# Altium footprint library Mi Libreria.PcbLib: 184 footprints (part 10 of 12)
Each footprint in its own frame and in the unit in brackets; x right, y up, seen from the top. Pads: shape width x height; smd on the part's side, far side on the other; paste and mask are expansions set on the pad; w line width, h text height; cw(c..) or ccw(c..) is an arc to the next point about the centre after c.
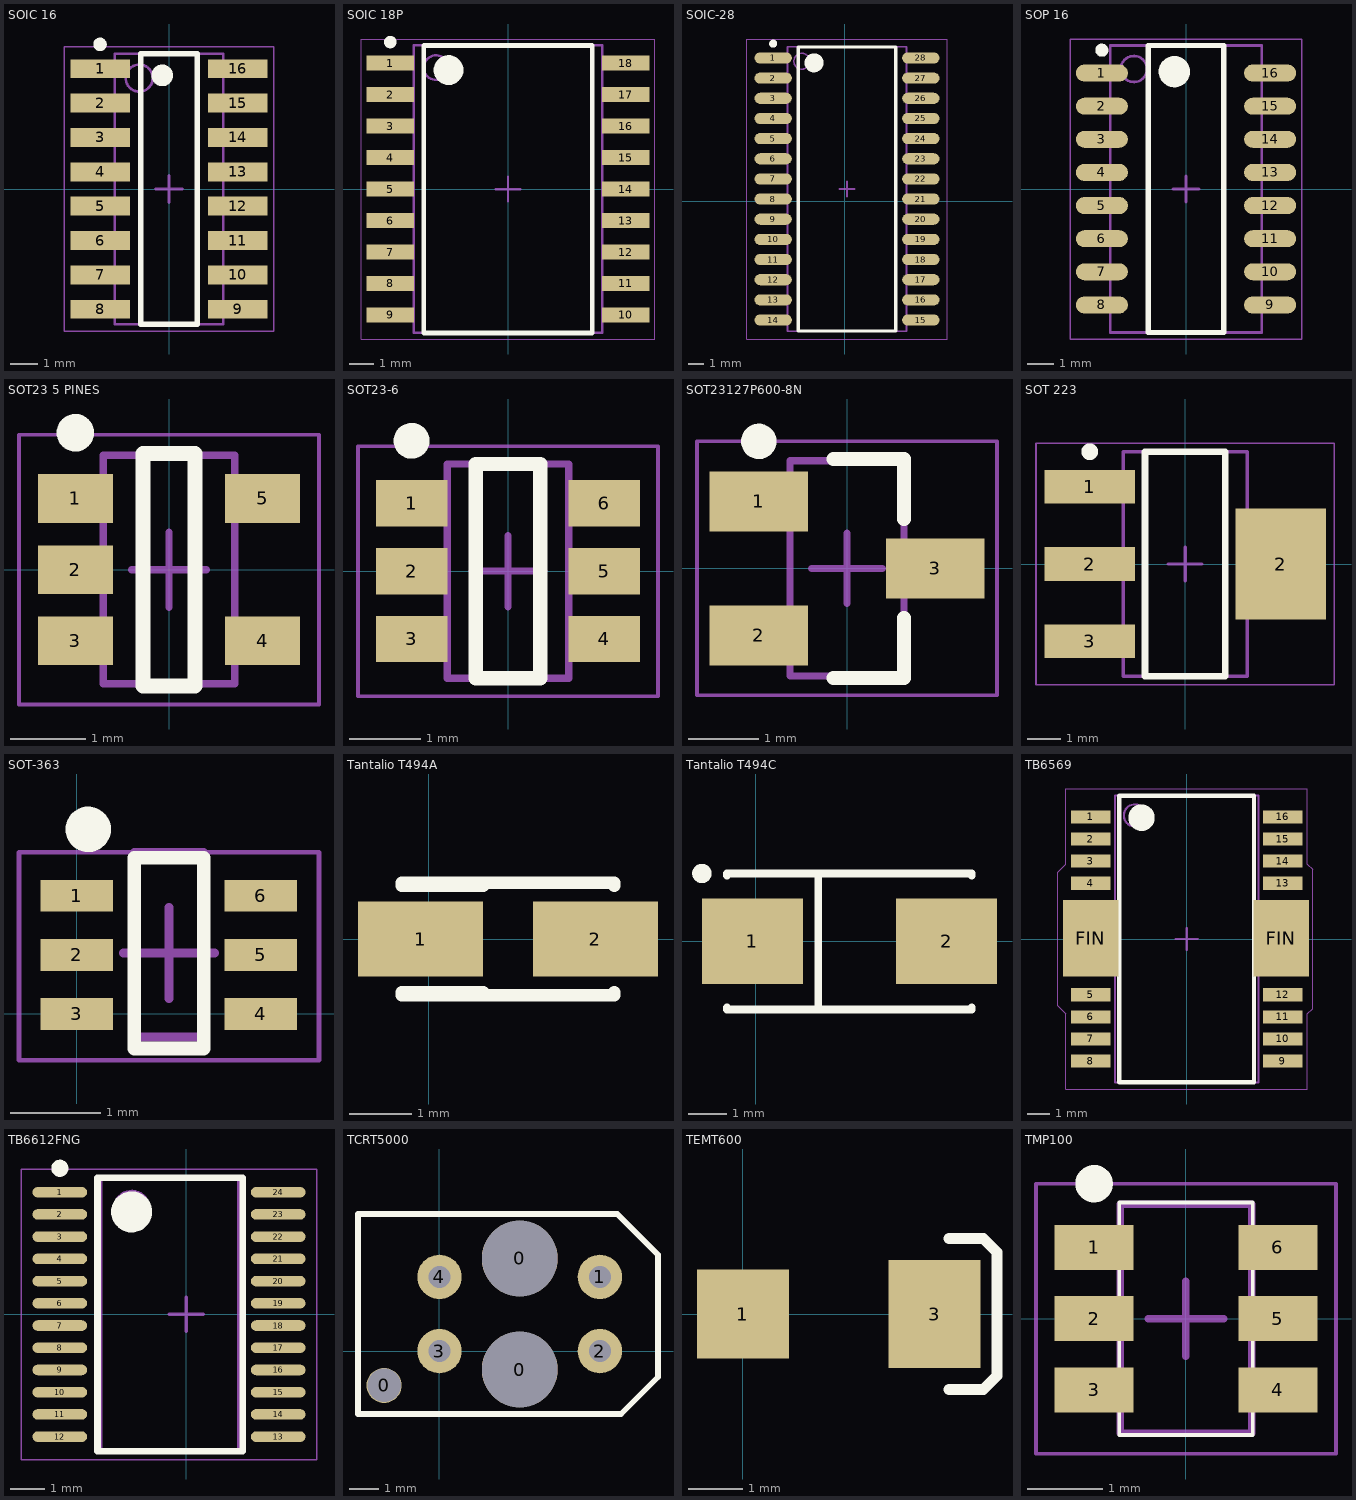
[diagram p9: the footprints below, top view; thin cyan lines are the x and y axes]

## SOIC 16 [mm] "SOIC 16P 1.27mm"
height 2
pads (16):
  rect 2.2x0.7 smd: 1(-2.55,4.445) 2(-2.55,3.175) 3(-2.55,1.905) 4(-2.55,0.635) 5(-2.55,-0.635) 6(-2.55,-1.905) 7(-2.55,-3.175) 8(-2.55,-4.445) 9(2.55,-4.445) 10(2.55,-3.175) 11(2.55,-1.905) 12(2.55,-0.635) 13(2.55,0.635) 14(2.55,1.905) 15(2.55,3.175) 16(2.55,4.445)
Top Overlay:
  circle w0.25: c-2.55,5.345 r0.125
  circle w0.4: c-0.25,4.2 r0.2
  lines w0.2: -1.05,-5 -1.05,5 1.05,5 1.05,-5 -1.05,-5
Mechanical 13:
  circle w0.1: c-1.1,4.1 r0.5
  lines w0.1: -2,-5 -2,5 2,5 2,-5 -2,-5
Mechanical 15:
  lines w0.05: -3.875,-5.25 -3.875,5.25 3.875,5.25 3.875,-5.25 -3.875,-5.25
  lines w0.1: -0.5,0 0.5,0 ; 0,-0.5 0,0.5
3D body "SOIC 16.step": height 1.4, standoff 0, extent -3,-4.95 3,4.95

## SOIC 18P [mm] "SOIC, 18-Leads, Body 11.55x7.50mm, Pitch 1.27mm, IPC Medium Density"
height 2.65
pads (18):
  rect 1.9x0.6 smd: 1(-4.75,5.08) 2(-4.75,3.81) 3(-4.75,2.54) 4(-4.75,1.27) 5(-4.75,0) 6(-4.75,-1.27) 7(-4.75,-2.54) 8(-4.75,-3.81) 9(-4.75,-5.08) 10(4.75,-5.08) 11(4.75,-3.81) 12(4.75,-2.54) 13(4.75,-1.27) 14(4.75,0) 15(4.75,1.27) 16(4.75,2.54) 17(4.75,3.81) 18(4.75,5.08)
Top Overlay:
  circle w0.25: c-4.75,5.93 r0.125
  circle w0.6: c-2.4,4.8 r0.3
  lines w0.2: -3.4,-5.8 -3.4,5.8 3.4,5.8 3.4,-5.8 -3.4,-5.8
Mechanical 13:
  circle w0.1: c-2.9,4.9 r0.5
  lines w0.1: -3.8,-5.8 -3.8,5.8 3.8,5.8 3.8,-5.8 -3.8,-5.8
Mechanical 15:
  lines w0.05: -5.925,-6.05 -5.925,6.05 5.925,6.05 5.925,-6.05 -5.925,-6.05
  lines w0.1: -0.5,0 0.5,0 ; 0,-0.5 0,0.5
3D body "SO-18W.STEP": height 2.48, standoff 0, extent -5.155,-5.79 5.155,5.79

## SOIC-28 [mm] "SOIC IC 28 PIN"
pads (28):
  oval 2.35x0.7 smd: 1(-4.523,9.017) 2(-4.523,7.747) 3(-4.523,6.477) 4(-4.523,5.207) 5(-4.523,3.937) 6(-4.523,2.667) 7(-4.523,1.397) 8(-4.523,0.127) 9(-4.523,-1.143) 10(-4.523,-2.413) 11(-4.523,-3.683) 12(-4.523,-4.953) 13(-4.523,-6.223) 14(-4.523,-7.493) 15(4.777,-7.493) 16(4.777,-6.223) 17(4.777,-4.953) 18(4.777,-3.683) 19(4.777,-2.413) 20(4.777,-1.143) 21(4.777,0.127) 22(4.777,1.397) 23(4.777,2.667) 24(4.777,3.937) 25(4.777,5.207) 26(4.777,6.477) 27(4.777,7.747) 28(4.777,9.017)
Top Overlay:
  circle w0.6: c-1.948,8.712 r0.3
  circle w0.25: c-4.523,9.917 r0.125
  lines w0.2: -2.948,-8.188 3.202,-8.188 3.202,9.712 -2.948,9.712 -2.948,-8.188
Mechanical 13:
  circle w0.1: c-2.723,8.812 r0.5
  lines w0.1: -3.623,-8.188 3.877,-8.188 3.877,9.712 -3.623,9.712 -3.623,-8.188
Mechanical 15:
  lines w0.05: -6.173,-8.688 6.427,-8.688 6.427,10.212 -6.173,10.212 -6.173,-8.688
  lines w0.1: -0.373,0.762 0.627,0.762 ; 0.127,0.262 0.127,1.262
3D body "28-SOIC.step": height 2.83, standoff 0.07, extent -5.023,-8.128 5.277,9.772

## SOP 16 [mm] "SMD CI"
height 2.65
pads (16):
  oval 2x0.65 smd: 1(-3.226,4.445) 2(-3.226,3.175) 3(-3.226,1.905) 4(-3.226,0.635) 5(-3.226,-0.635) 6(-3.226,-1.905) 7(-3.226,-3.175) 8(-3.226,-4.445) 9(3.226,-4.445) 10(3.226,-3.175) 11(3.226,-1.905) 12(3.226,-0.635) 13(3.226,0.635) 14(3.226,1.905) 15(3.226,3.175) 16(3.226,4.445)
Top Overlay:
  circle w0.6: c-0.45,4.5 r0.3
  circle w0.25: c-3.226,5.32 r0.125
  lines w0.2: -1.45,-5.5 1.45,-5.5 1.45,5.5 -1.45,5.5 -1.45,-5.5
Mechanical 13:
  circle w0.1: c-2,4.6 r0.5
  lines w0.1: -2.9,-5.5 2.9,-5.5 2.9,5.5 -2.9,5.5 -2.9,-5.5
Mechanical 15:
  lines w0.05: -4.445,-5.75 4.445,-5.75 4.445,5.75 -4.445,5.75 -4.445,-5.75
  lines w0.1: -0.5,0 0.5,0 ; 0,-0.5 0,0.5
3D body: height 2.65, standoff 0.1, extent -2.9,-5.5 2.9,5.5

## SOT23 5 PINES [mm] "SOT 23-5"
height 1.4
pads (5):
  rect 1x0.65 smd: 1(-1.25,0.95) 2(-1.25,0) 3(-1.25,-0.95) 4(1.25,-0.95) 5(1.25,0.95)
Top Overlay:
  circle w0.25: c-1.25,1.825 r0.125
  lines w0.2: -0.35,-1.55 0.35,-1.55 0.35,1.55 -0.35,1.55 -0.35,-1.55
Mechanical 13:
  lines w0.1: -0.875,-1.525 -0.875,1.525 0.875,1.525 0.875,-1.525 -0.875,-1.525
Mechanical 15:
  lines w0.05: -2,-1.8 -2,1.8 2,1.8 2,-1.8 -2,-1.8
  lines w0.1: -0.5,0 0.5,0 ; 0,-0.5 0,0.5
3D body "SOT-23-5.step": height 1.05, standoff -0.05, extent -1.25,-1.5 1.25,1.5

## SOT23-6 [mm] "SOT23, 6-Leads, Body 2.90x2.80mm, Pitch 0.95mm, IPC Medium Density"
height 1.23
pads (6):
  rect 1x0.65 smd: 1(-1.35,0.95) 2(-1.35,0) 3(-1.35,-0.95) 4(1.35,-0.95) 5(1.35,0) 6(1.35,0.95)
Top Overlay:
  circle w0.25: c-1.35,1.825 r0.125
  lines w0.2: -0.45,-1.5 -0.45,1.5 0.45,1.5 0.45,-1.5 -0.45,-1.5
Mechanical 13:
  lines w0.1: -0.85,-1.5 0.85,-1.5 0.85,1.5 -0.85,1.5 -0.85,-1.5
Mechanical 15:
  lines w0.05: -2.1,-1.75 2.1,-1.75 2.1,1.75 -2.1,1.75 -2.1,-1.75
  lines w0.1: -0.5,0 0.5,0 ; 0,-0.5 0,0.5
3D body "SOT23-6.step": height 1.23, standoff 0, extent -1.5,-1.5 1.5,1.5

## SOT23127P600-8N [mm]
height 1
pads (3):
  rect 1.4x0.85 smd: 1(-1.25,0.95) 2(-1.25,-0.95) 3(1.25,0)
Top Overlay:
  circle w0.25: c-1.25,1.8 r0.125
  lines w0.2: -0.19,-1.55 0.81,-1.55 0.81,-0.7 ; -0.19,1.55 0.81,1.55 0.81,0.7
Mechanical 13:
  lines w0.1: -0.81,-1.525 -0.81,1.525 0.81,1.525 0.81,-1.525 -0.81,-1.525
Mechanical 15:
  lines w0.05: -2.125,-1.8 -2.125,1.8 2.125,1.8 2.125,-1.8 -2.125,-1.8
  lines w0.1: -0.5,0 0.5,0 ; 0,-0.5 0,0.5
3D body "SOT23.STEP": height 0.95, standoff -0.15, extent -1.25,-1.524 1.25,1.476

## SOT 223 [mm] "SOT223, 4-Leads, Body 6.50x7.10mm (avg), Pitch 2.30mm, IPC Medium Density"
height 1.8
pads (4):
  rect 2.7x1 smd: 1(-2.85,2.3) 2(-2.85,0) 3(-2.85,-2.3)
  rect 2.7x3.3 smd: 2(2.85,0)
Top Overlay:
  circle w0.25: c-2.85,3.35 r0.125
  lines w0.2: -1.2,-3.35 -1.2,3.35 1.2,3.35 1.2,-3.35 -1.2,-3.35
Mechanical 13:
  lines w0.1: -1.85,-3.35 -1.85,3.35 1.85,3.35 1.85,-3.35 -1.85,-3.35
Mechanical 15:
  lines w0.05: -4.45,-3.6 -4.45,3.6 4.45,3.6 4.45,-3.6 -4.45,-3.6
  lines w0.1: -0.5,0 0.5,0 ; 0,-0.5 0,0.5
3D body "SOT-223.step": height 1.65, standoff -0.03, extent -3.48,-3.25 3.48,3.25

## SOT-363 [mm] "SOT-363 6PIN SC70-6"
pads (6):
  rect 0.8x0.35 smd: 1(0,1.3) 2(0,0.65) 3(0,0) 4(2.027,0) 5(2.027,0.65) 6(2.027,1.3)
Top Overlay:
  circle w0.25: c0.127,2.032 r0.125
  lines w0.15: 0.635,-0.381 1.397,-0.381 1.397,1.719 0.635,1.719 0.635,-0.381
Mechanical 13:
  lines w0.1: 0.635,-0.254 0.635,1.778 1.397,1.778 1.397,-0.254 0.635,-0.254
Mechanical 15:
  lines w0.05: -0.635,-0.508 -0.635,1.778 2.667,1.778 2.667,-0.508 -0.635,-0.508
  lines w0.1: 0.516,0.669 1.516,0.669 ; 1.016,0.169 1.016,1.169
3D body "SOT363.step": height 1, standoff 0, extent -0.134,-0.415 2.166,1.685

## Tantalio T494A [mm] "Capacitor SMD"
pads (2):
  rect 2x1.2 smd: 1(-0.13,0) 2(2.67,0)
Top Overlay:
  lines w0.2: -0.43,-0.9 2.97,-0.9 2.97,-0.85 ; -0.43,-0.85 0.87,-0.85 ; -0.43,0.85 0.87,0.85 ; -0.43,0.9 2.97,0.9 2.97,0.85
3D body "CAP_TANT_3216-18_A_case.step": height 1.8, standoff 0, extent -0.476,-0.9 2.924,0.9

## Tantalio T494C [mm]
pads (2):
  rect 2.6x2.2 smd: 1(-0.087,0) 2(4.913,0)
Top Overlay:
  circle w0.25: c-1.387,1.75 r0.125
  lines w0.2: -0.737,-1.7 -0.737,-1.75 5.563,-1.75 5.563,-1.7 ; -0.737,1.7 -0.737,1.75 5.563,1.75 5.563,1.7 ; 1.613,-1.75 1.613,1.75
3D body "T491C.STEP": height 2.7, standoff 0, extent -0.637,-1.675 5.463,1.675

## TB6569 [mm] "DRIVER DC MOTOR"
height 2.65
pads (18):
  rect 1.8x0.6 smd: 1(-4.35,5.532) 2(-4.35,4.532) 3(-4.35,3.532) 4(-4.35,2.532) 5(-4.35,-2.532) 6(-4.35,-3.532) 7(-4.35,-4.532) 8(-4.35,-5.532) 9(4.35,-5.532) 10(4.35,-4.532) 11(4.35,-3.532) 12(4.35,-2.532) 13(4.35,2.532) 14(4.35,3.532) 15(4.35,4.532) 16(4.35,5.532)
  rect 2.5x3.45 smd: FIN(-4.35,0.032) FIN(4.286,0.032)
Top Overlay:
  circle w0.6: c-2.05,5.5 r0.3
  lines w0.2: -3.05,-6.5 -3.05,6.5 3.05,6.5 3.05,-6.5 -3.05,-6.5
Mechanical 13:
  circle w0.1: c-2.35,5.6 r0.5
  lines w0.1: -3.25,-6.5 -3.25,6.5 3.25,6.5 3.25,-6.5 -3.25,-6.5
Mechanical 15:
  lines w0.05: -5.842,-3.033 -5.475,-3.4 -5.475,-6.8 5.475,-6.8 5.475,-3.4 5.715,-3.16 5.715,3.16 5.475,3.4 5.475,6.8 -5.475,6.8 -5.475,3.4 -5.842,3.033 -5.842,-3.033
  lines w0.1: -0.5,0 0.5,0 ; 0,-0.5 0,0.5
3D body "TB6569FG.step": height 2.4, standoff 0, extent -4.8,-6.5 4.8,6.5

## TB6612FNG [mm] "SOP, 24-Leads, Body 8.00x5.00mm, Pitch 0.65mm, IPC Medium Density"
height 2
pads (24):
  oval 1.6x0.31 smd: 1(-3.7,3.575) 2(-3.7,2.925) 3(-3.7,2.275) 4(-3.7,1.625) 5(-3.7,0.975) 6(-3.7,0.325) 7(-3.7,-0.325) 8(-3.7,-0.975) 9(-3.7,-1.625) 10(-3.7,-2.275) 11(-3.7,-2.925) 12(-3.7,-3.575) 13(2.684,-3.575) 14(2.684,-2.925) 15(2.684,-2.275) 16(2.684,-1.625) 17(2.684,-0.975) 18(2.684,-0.325) 19(2.684,0.325) 20(2.684,0.975) 21(2.684,1.625) 22(2.684,2.275) 23(2.684,2.925) 24(2.684,3.575)
Top Overlay:
  circle w0.25: c-3.7,4.275 r0.125
  circle w0.6: c-1.6,3 r0.3
  lines w0.2: -2.6,-4 -2.6,4 1.651,4 1.651,-4 -2.6,-4
Mechanical 13:
  circle w0.1: c-1.6,3.1 r0.5
  lines w0.1: -2.5,-4 -2.5,4 1.524,4 1.524,-4 -2.5,-4
Mechanical 15:
  lines w0.05: -4.826,-4.25 -4.826,4.25 3.81,4.25 3.81,-4.25 -4.826,-4.25
  lines w0.1: -0.5,0 0.5,0 ; 0,-0.5 0,0.5
3D body "TSSOP-24.step": height 1.2, standoff 0, extent -3.783,-3.963 2.767,3.937

## TCRT5000 [mm]
pads (7):
  round 1.2 hole 1.15: 0(-1.9,-1.18)
  round 2.6 hole 2.6: 0(2.75,-0.635) 0(2.75,3.175)
  round 1.524 hole 0.762: 1(5.5,2.54) 2(5.5,0) 3(0,0) 4(0,2.54)
Top Overlay:
  lines w0.2: -2.794,-2.159 6.223,-2.159 7.493,-0.889 7.493,3.302 6.096,4.699 -2.794,4.699 -2.794,-2.159
3D body: height 6.3, standoff 2.7, extent 3.68,-0.395 7.261,3.189
3D body: height 6.3, standoff 2.7, extent -1.781,-0.522 1.8,3.062
3D body: height 2.5, standoff 0.5, extent -2.297,-1.579 -1.5,-0.781
3D body: height 2, standoff -1, extent 1.857,-1.533 3.65,0.263
3D body: height 2, standoff -1, extent 1.857,2.277 3.65,4.073
3D body: height 2, standoff -3, extent -0.297,2.241 0.3,2.84
3D body: height 2, standoff -3, extent 5.203,2.241 5.8,2.84
3D body: height 2, standoff -3, extent 5.203,-0.299 5.8,0.3
3D body: height 2, standoff -3, extent -0.297,-0.299 0.3,0.3
3D body: height 4, standoff 1, extent -2.794,-2.159 7.62,4.699

## TEMT600 [mm] "Sensor Light SMD"
pads (2):
  rect 1.7x1.65 smd: 1(0,0)
  rect 1.7x2 smd: 3(3.544,0)
Top Overlay:
  lines w0.2: 3.81,-1.397 4.445,-1.397 4.699,-1.143 4.699,1.143 4.445,1.397 3.81,1.397
3D body "Temt 6000.step": height 0.81, standoff -0.23, extent -0.222,-1 3.778,1

## TMP100 [mm] "SOT23, 6-Leads, Body 2.90x2.85mm, Pitch 0.95mm, IPC Medium Density"
height 1.45
pads (6):
  rect 1.05x0.6 smd: 1(-1.225,0.95) 2(-1.225,0) 3(-1.225,-0.95) 4(1.225,-0.95) 5(1.225,0) 6(1.225,0.95)
Top Overlay:
  circle w0.25: c-1.225,1.8 r0.125
  lines w0.05: -0.889,-1.55 0.889,-1.55 0.889,1.55 -0.889,1.55 -0.889,-1.55
Mechanical 13:
  lines w0.1: -0.875,-1.525 -0.875,1.525 0.875,1.525 0.875,-1.525 -0.875,-1.525
Mechanical 15:
  lines w0.05: -2,-1.8 -2,1.8 2,1.8 2,-1.8 -2,-1.8
  lines w0.1: -0.5,0 0.5,0 ; 0,-0.5 0,0.5
3D body: height 1.45, standoff 0.1, extent -0.875,-1.525 0.875,1.525